# Altium footprint library my_lib.PcbLib: 121 footprints (part 3 of 8)
Each footprint in its own frame and in the unit in brackets; x right, y up, seen from the top. Pads: shape width x height; smd on the part's side, far side on the other; paste and mask are expansions set on the pad; w line width, h text height; cw(c..) or ccw(c..) is an arc to the next point about the centre after c.
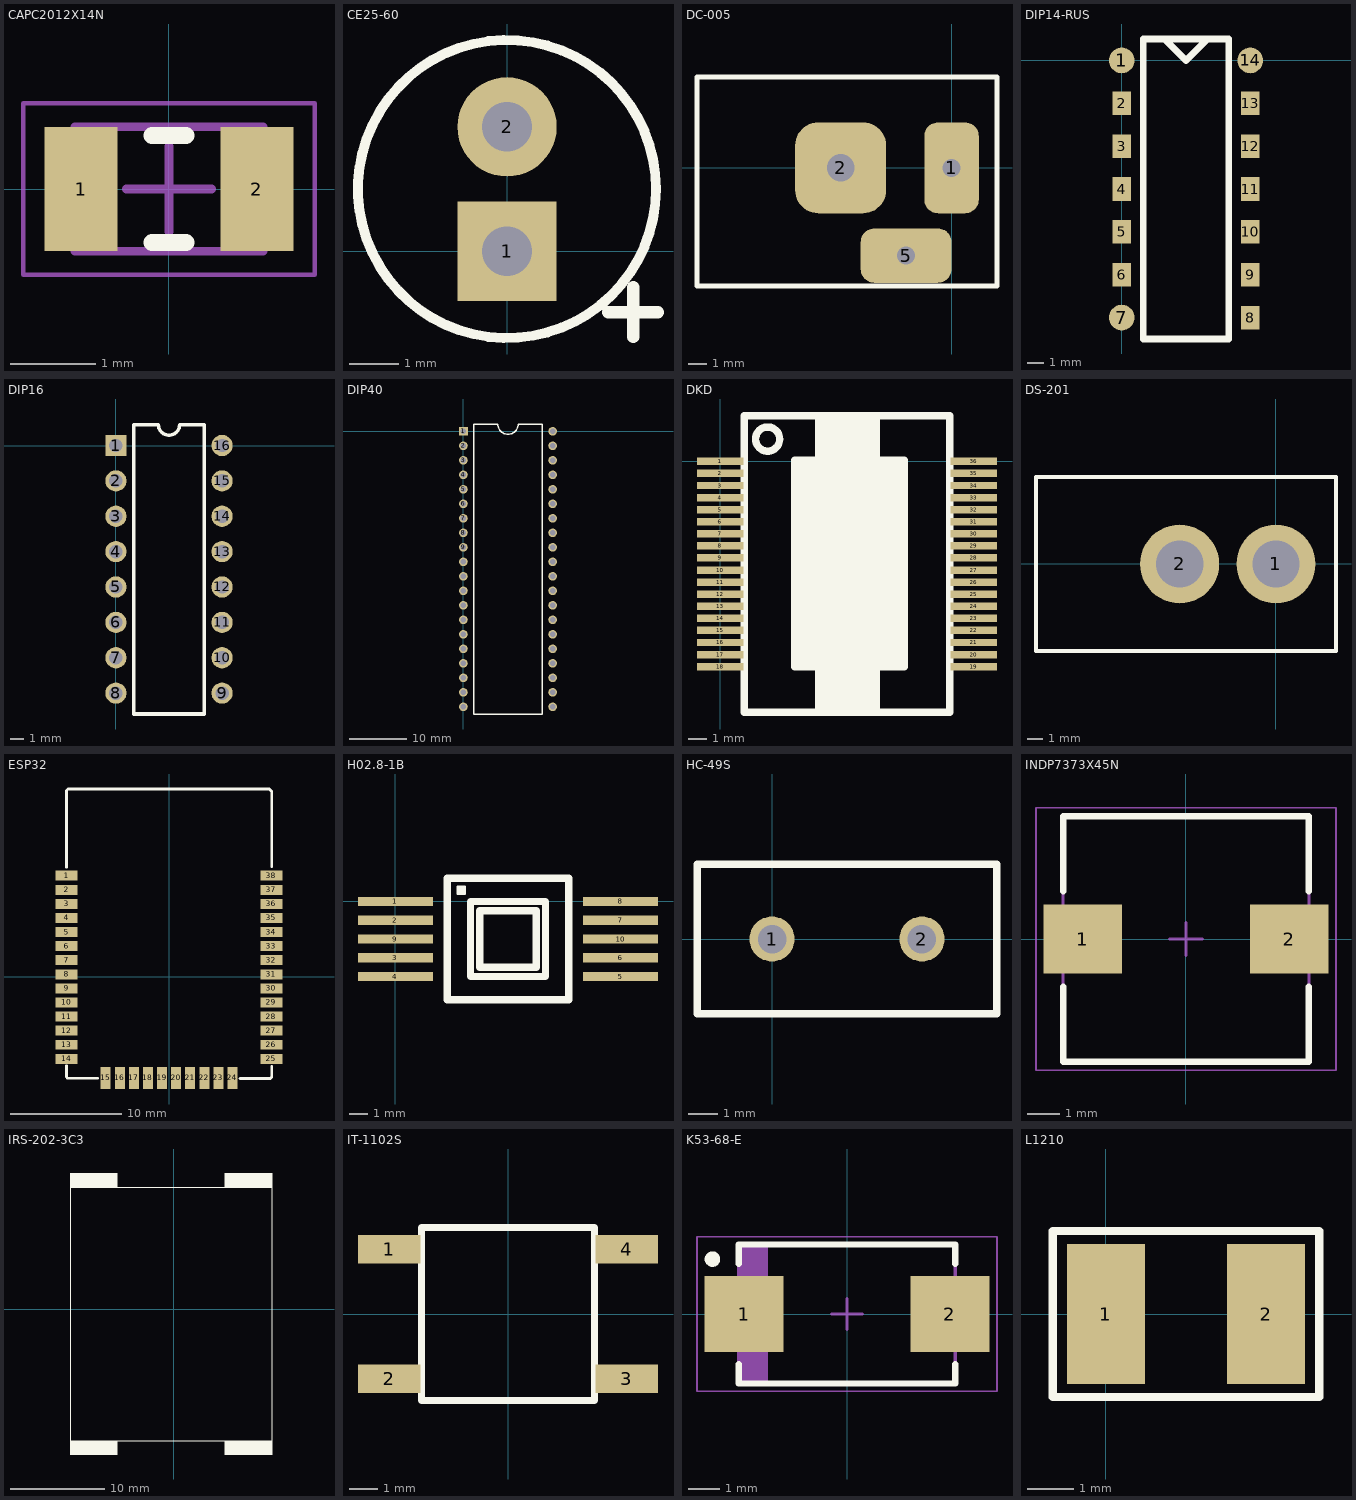
[diagram p2: the footprints below, top view; thin cyan lines are the x and y axes]

## CAPC2012X14N [mm] "Chip Capacitor, 2-Leads, Body 2,00x1,25mm, IPC Medium Density"
height 1.45
pads (2):
  rect 0.85x1.45 smd: 1(-1.025,0) 2(1.025,0)
Top Overlay:
  lines w0.2: -0.2,-0.625 0.2,-0.625 ; -0.2,0.625 0.2,0.625
Mechanical 13:
  lines w0.1: -1.1,-0.725 1.1,-0.725 1.1,0.725 -1.1,0.725 -1.1,-0.725
Mechanical 15:
  lines w0.05: -1.7,-1 1.7,-1 1.7,1 -1.7,1 -1.7,-1
  lines w0.1: -0.5,0 0.5,0 ; 0,-0.5 0,0.5
3D body "CAPC2012X14N.step": height 1.45, standoff 0, extent -1.1,-0.725 1.1,0.725

## CE25-60 [mm]
pads (2):
  rect 2x2 hole 1: 1(0,0)
  round 2 hole 1: 2(0,2.5)
Top Overlay:
  circle w0.2: c0,1.25 r3
  lines w0.25: 2.04,-1.23 3.04,-1.23 ; 2.54,-1.73 2.54,-0.73

## DC-005 [mm] "Раазъем питания на плату"
pads (3):
  rrect50% 3x5 hole 1 square: 1(0,0)
  rrect50% 5x5 hole 1.5 square: 2(-6.1,0)
  rrect50% 5x3 hole 1 square: 5(-2.5,-4.825)
Top Overlay:
  lines w0.254: -14,-6.5 2.5,-6.5 2.5,-0.2 2.5,5 -14,5 -14,-6.5
3D body "KLS1-DC-005.step": height 11, standoff -4.09, extent -13.55,-5.225 0.85,4.475

## DIP14-RUS [mm]
pads (14):
  round 1.524 all layers, no hole: 1(0,0) 7(0,-15.24) 14(7.62,0)
  rect 1.1x1.4 smd: 2(0,-2.54) 3(0,-5.08) 4(0,-7.62) 5(0,-10.16) 6(0,-12.7) 8(7.62,-15.24) 9(7.62,-12.7) 10(7.62,-10.16) 11(7.62,-7.62) 12(7.62,-5.08) 13(7.62,-2.54)
Top Overlay:
  lines w0.4: 2.54,1.27 3.81,0 5.08,1.27 ; 1.27,-16.51 6.35,-16.51 6.35,1.27 1.27,1.27 1.27,-16.51

## DIP16 [mil]
pads (16):
  rect 60x60 hole 38: 1(0,0)
  round 60 hole 38: 2(0,-100) 3(0,-200) 4(0,-300) 5(0,-400) 6(0,-500) 7(0,-600) 8(0,-700) 9(300,-700) 10(300,-600) 11(300,-500) 12(300,-400) 13(300,-300) 14(300,-200) 15(300,-100) 16(300,0)
Top Overlay:
  lines w10: 50,-759.06 50,59.06 120,59.06 ccw(c150,59.06) 180,59.06 250,59.06 250,-759.06 50,-759.06

## DIP40 [mil]
pads (40):
  rect 60x60 hole 38: 1(0,0)
  round 60 hole 38: 2(0,-100) 3(0,-200) 4(0,-300) 5(0,-400) 6(0,-500) 7(0,-600) 8(0,-700) 9(0,-800) 10(0,-900) 11(0,-1000) 12(0,-1100) 13(0,-1200) 14(0,-1300) 15(0,-1400) 16(0,-1500) 17(0,-1600) 18(0,-1700) 19(0,-1800) 20(0,-1900) 21(614.96,-1900) 22(614.96,-1800) 23(614.96,-1700) 24(614.96,-1600) 25(614.96,-1500) 26(614.96,-1400) 27(614.96,-1300) 28(614.96,-1200) 29(614.96,-1100) 30(614.96,-1000) 31(614.96,-900) 32(614.96,-800) 33(614.96,-700) 34(614.96,-600) 35(614.96,-500) 36(614.96,-400) 37(614.96,-300) 38(614.96,-200) 39(614.96,-100) 40(614.96,0)
Top Overlay:
  lines w10: 69.69,-1949.61 69.69,49.61 237.48,49.61 ccw(c307.48,49.61) 377.48,49.61 545.28,49.61 545.28,-1949.61 69.69,-1949.61

## DKD [mm]
pads (36):
  rect 2.5x0.4 smd: 1(0,0) 2(0,-0.65) 3(0,-1.3) 4(0,-1.95) 5(0,-2.6) 6(0,-3.25) 7(0,-3.9) 8(0,-4.55) 9(0,-5.2) 10(0,-5.85) 11(0,-6.5) 12(0,-7.15) 13(0,-7.8) 14(0,-8.45) 15(0,-9.1) 16(0,-9.75) 17(0,-10.4) 18(0,-11.05) 19(13.65,-11.05) 20(13.65,-10.4) 21(13.65,-9.75) 22(13.65,-9.1) 23(13.65,-8.45) 24(13.65,-7.8) 25(13.65,-7.15) 26(13.65,-6.5) 27(13.65,-5.85) 28(13.65,-5.2) 29(13.65,-4.55) 30(13.65,-3.9) 31(13.65,-3.25) 32(13.65,-2.6) 33(13.65,-1.95) 34(13.65,-1.3) 35(13.65,-0.65) 36(13.65,0)
Top Overlay:
  region: 5.3,2.45 5.3,0.15 4,0.05 4,-11.05 5.3,-11.15 5.3,-13.45 8.4,-13.45 8.4,-11.05 9.9,-11.05 9.9,0.05 8.4,0.05 8.4,2.35
  lines w0.4: 1.3,-13.5 12.35,-13.5 ; 1.3,-13.45 1.3,2.45 12.35,2.45 12.35,-13.45 ; 5.3,-13.45 5.3,-11.05 4,-11.05 4,0.05 5.3,0.05 5.3,2.45 ; 8.4,-13.45 8.4,-11.05 9.9,-11.05 9.9,0.05 8.4,0.05 8.4,2.45 ; 1.9,1.2 cw(c2.55,1.2) 3.2,1.2 cw(c2.55,1.2) 1.9,1.2

## DS-201 [mm] "Раазъем питания на плату"
pads (2):
  round 5 hole 3: 1(0,0) 2(-6.1,0)
Top Overlay:
  lines w0.254: -15.2,-5.5 3.8,-5.5 3.8,-2.5 3.8,5.5 -15.2,5.5 -15.2,-5.5
3D body "DS-201.stp": height 4.39, standoff -11, extent -13.9,-4.5 0.6,4.5

## ESP32 [mm]
pads (38):
  rect 2x0.9 smd: 1(-9.24,9.115) 2(-9.24,7.845) 3(-9.24,6.575) 4(-9.24,5.305) 5(-9.24,4.035) 6(-9.24,2.765) 7(-9.24,1.495) 8(-9.24,0.225) 9(-9.24,-1.045) 10(-9.24,-2.315) 11(-9.24,-3.585) 12(-9.24,-4.855) 13(-9.24,-6.125) 14(-9.24,-7.395) 25(9.24,-7.395) 26(9.24,-6.125) 27(9.24,-4.855) 28(9.24,-3.585) 29(9.24,-2.315) 30(9.24,-1.045) 31(9.24,0.225) 32(9.24,1.495) 33(9.24,2.765) 34(9.24,4.035) 35(9.24,5.305) 36(9.24,6.575) 37(9.24,7.845) 38(9.24,9.115)
  rect 0.9x2 smd: 15(-5.705,-9.115) 16(-4.435,-9.115) 17(-3.165,-9.115) 18(-1.895,-9.115) 19(-0.625,-9.115) 20(0.645,-9.115) 21(1.915,-9.115) 22(3.185,-9.115) 23(4.455,-9.115) 24(5.725,-9.115)
Top Overlay:
  lines w0.254: -9.23,-8.015 -9.23,-9.04 -9.13,-9.14 -6.455,-9.14 ; -9.23,9.885 -9.23,16.81 -9.105,16.935 9.045,16.935 9.27,16.71 9.27,9.96 ; 6.395,-9.165 9.145,-9.165 9.27,-9.04 9.27,-8.065
3D body "User Library-ESP32-WROOM-32E-1.SLDPRT": height 3.15, standoff -0.02, extent -9.005,-8.908 9.031,16.61

## H02.8-1B [mm]
pads (10):
  rect 4x0.5 smd: 1(0,0) 2(0,-1) 3(0,-3) 4(0,-4) 5(12,-4) 6(12,-3) 7(12,-1) 8(12,0) 9(0,-2) 10(12,-2)
Top Overlay:
  region: 3.7,0.8 3.3,0.8 3.3,0.4 3.7,0.4
  lines w0.1: 3.3,0.4 3.3,0.8 3.7,0.8 3.7,0.4 3.3,0.4
  lines w0.4: 2.75,-5.25 9.25,-5.25 9.25,1.25 2.75,1.25 2.75,-5.25 ; 4,-4 8,-4 8,0 4,0 4,-4 ; 4.5,-3.5 4.5,-0.5 7.5,-0.5 7.5,-3.5 4.5,-3.5

## HC-49S [mil]
pads (2):
  round 60 hole 38: 1(0,0) 2(200,0)
Top Overlay:
  lines w10: -100,-100 300,-100 300,100 -100,100 -100,-100

## INDP7373X45N [mm] "Precision Wire Wound Inductor, 2-Leads, Body 7,30x7,30mm, IPC Medium Density"
height 4.5
pads (2):
  rect 2.4x2.1 smd: 1(-3.15,0) 2(3.15,0)
Top Overlay:
  lines w0.2: -3.75,-1.45 -3.75,-3.75 3.75,-3.75 3.75,-1.45 ; -3.75,1.45 -3.75,3.75 3.75,3.75 3.75,1.45
Mechanical 13:
  lines w0.1: -3.75,-3.75 3.75,-3.75 3.75,3.75 -3.75,3.75 -3.75,-3.75
Mechanical 15:
  lines w0.05: -4.575,-4 4.575,-4 4.575,4 -4.575,4 -4.575,-4
  lines w0.1: -0.5,0 0.5,0 ; 0,-0.5 0,0.5
3D body "INDP7373X45N.step": height 4.6, standoff 0, extent -3.75,-3.65 3.75,3.65

## IRS-202-3C3 [mm]
Top Overlay:
  region: -11,-14 -11,-15.5 -6,-15.5 -6,-14
  region: 5.5,-14 5.5,-15.5 10.5,-15.5 10.5,-14
  region: -11,14.5 -11,13 -6,13 -6,14.5
  region: 5.5,14.5 5.5,13 10.5,13 10.5,14.5
  lines w0.1: -11,-15.5 -11,-14 ; -6,-15.5 -6,-14 -11,-14 ; -6,13 -6,14.5 -11,14.5 -11,13 ; 5.5,-15.5 5.5,-14 10.5,-14 ; 5.5,13 5.5,14.5 10.5,14.5 10.5,13 ; 10.5,-15.5 10.5,-14 ; -11,-14 -11,13 ; -11,-14 10.5,-14 ; -11,13 10.5,13 ; 10.5,-14 10.5,13
Top Paste:
  region: -13,-16.5 -11,-16.5 -11,13 -13,13
  region: 10.5,13 10.5,-14.5 12,-14 12,13
  region: -11,-14 -11,-16.5 12,-16.5 12,-14
  region: -13,13 12,13 12,15.5 -13,15.5
  lines w0.254: -11,0 10.5,0 ; -13,-16.5 -13,15.5 12,15.5 12,-16.5 -13,-16.5 ; -11,-14 -11,13 10.5,13 10.5,-14 -11,-14
  lines w1: 0,3 0,9 ; -3.5,-7 cw(c0,-7) 3.5,-7 cw(c0,-7) -3.5,-7

## IT-1102S [mm]
pads (4):
  rect 2.2x1 smd: 1(-4.191,2.286) 2(-4.191,-2.286) 3(4.191,-2.286) 4(4.191,2.286)
Top Overlay:
  lines w0.254: -3.048,-3.048 3.048,-3.048 3.048,3.048 -3.048,3.048 -3.048,-3.048
3D body "User Library-TACT SMD 6X6.sldprt": height 5, standoff 0, extent -5,-3 5,3

## K53-68-E [mm] "Molded Capacitor, 2-Leads, Body 7,30x4,30mm, IPC Medium Density"
height 4.4
pads (2):
  rect 2.55x2.45 smd: 1(-3.325,0) 2(3.325,0)
Top Overlay:
  circle w0.25: c-4.35,1.775 r0.125
  lines w0.2: -3.5,-1.625 -3.5,-2.25 3.5,-2.25 3.5,-1.625 ; -3.5,1.625 -3.5,2.25 3.5,2.25 3.5,1.625
Mechanical 13:
  rectangle: -3.5,-2.25 -2.558,2.25
  lines w0.1: -3.5,-2.25 -3.5,2.25 3.5,2.25 3.5,-2.25 -3.5,-2.25
Mechanical 15:
  lines w0.05: -4.85,-2.5 -4.85,2.5 4.85,2.5 4.85,-2.5 -4.85,-2.5
  lines w0.1: -0.5,0 0.5,0 ; 0,-0.5 0,0.5
3D body "K53-68-E.step": height 4.4, standoff 0, extent -3.72,-2.25 3.72,2.25

## L1210 [mm]
pads (2):
  rect 1.675x3 smd: 1(0,0) 2(3.429,0)
Top Overlay:
  lines w0.178: -1.143,-1.778 -1.143,1.778 4.572,1.778 4.572,-1.778 -1.143,-1.778